# Altium footprint library Led & Displays.PcbLib: 52 footprints (part 4 of 4)
Each footprint in its own frame and in the unit in brackets; x right, y up, seen from the top. Pads: shape width x height; smd on the part's side, far side on the other; paste and mask are expansions set on the pad; w line width, h text height; cw(c..) or ccw(c..) is an arc to the next point about the centre after c.
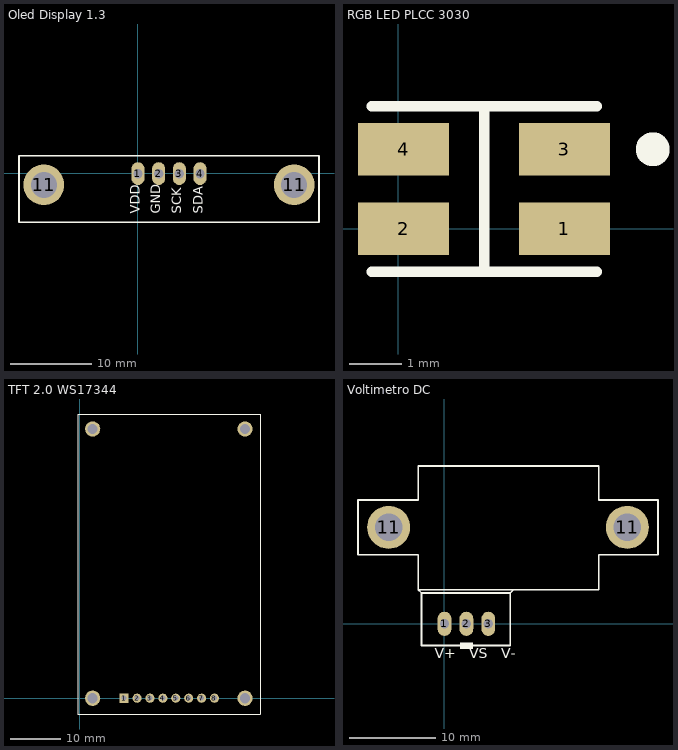
[diagram p3: the footprints below, top view; thin cyan lines are the x and y axes]

## Oled Display 1.3 [mm] "Oled Display I2C 1.3 Inch Module"
pads (6):
  oval 1.6x2.8 hole 1.15: 1(0,-0.015) 2(2.54,-0.015) 3(5.08,-0.015) 4(7.62,-0.015)
  round 5 hole 3.2: 11(-11.557,-1.397) 11(19.177,-1.397)
Top Overlay:
  lines w0.2: -14.605,-5.969 22.225,-5.969 22.225,2.159 21.971,2.159 -14.605,2.159 -14.605,-5.969
  text "VDD" at 0.635,-4.953 h2
  text "GND" at 3.175,-4.953 h2
  text "SCK" at 5.715,-4.953 h2
  text "SDA" at 8.382,-4.953 h2
3D body: height 0.25, standoff 0, extent 4.508,-1.905 4.508,-1.905
3D body "Oled SH1106 1.3.SLDPRT": height 25.6, standoff 13.5, extent -14.19,-32.748 21.81,1.252
3D body "HH4X1.stp": height 8.5, standoff -3.2, extent -1.268,-1.25 9.142,1.25

## RGB LED PLCC 3030 [mm] "LEd RGB Plcc"
pads (4):
  rect 1.75x1 smd: 1(3.195,0) 2(0.107,0) 3(3.195,1.524) 4(0.107,1.524)
Top Overlay:
  circle w0.45: c4.889,1.524 r0.1
  lines w0.2: -0.508,-0.826 3.81,-0.826 ; -0.508,2.349 3.81,2.349 ; 1.651,-0.762 1.651,2.286
3D body "Osram Led PLCC4.step": height 1.95, standoff 0, extent -0.099,-0.638 3.401,2.162

## TFT 2.0 WS17344 [mm] "TFT IPS Display 2.0 Inch Waveshare 17344"
pads (12):
  rect 1.8x1.8 hole 1: 1(8.7,0)
  round 1.8 hole 1: 2(11.239,0) 3(13.779,0) 4(16.319,0) 5(18.86,0) 6(21.399,0) 7(23.939,0) 8(26.479,0)
  round 3 hole 2: ""(2.5,0) ""(2.5,53) ""(32.5,0) ""(32.5,53)
Top Overlay:
  lines w0.2: -0.445,-3.111 -0.445,55.944 35.496,55.944 35.496,-3.111 -0.445,-3.111
3D body: height 9.6, standoff 8, extent 0.064,-2.286 34.734,55.499
3D body: height 8, standoff 0, extent 0.881,51.508 4.119,54.492
3D body: height 8, standoff 0, extent 30.881,51.508 34.119,54.492
3D body: height 8, standoff 0, extent 0.881,-1.492 4.119,1.492
3D body: height 8, standoff 0, extent 30.881,-1.492 34.119,1.492
3D body "HH8X1.stp": height 8.5, standoff -3.2, extent 7.302,-1.25 27.873,1.25

## Voltimetro DC [mm] "Medidor de Voltaje DC 0-30V 2Pin"
pads (5):
  oval 1.6x2.8 hole 1.1: 1(0,-0.015) 2(2.54,-0.015) 3(5.08,-0.015)
  round 5 hole 3.2: 11(-6.477,11.176) 11(21.209,11.176)
Top Overlay:
  rectangle: 1.778,-2.921 3.302,-2.159
  lines w0.2: 8.001,3.937 7.62,3.556 ; -3.048,3.937 -3.048,8.001 -10.033,8.001 -10.033,14.351 -3.048,14.351 -3.048,18.288 17.907,18.288 17.907,14.351 24.765,14.351 24.765,8.001 17.907,8.001 17.907,3.937 -3.048,3.937 ; -3.048,3.937 -2.667,3.556 ; -2.667,3.556 -2.667,-2.54 7.62,-2.54 7.62,3.556 ; -2.667,3.556 7.62,3.556
  text "V+   VS   V-" at -1.143,-4.445 h2
3D body "DC 0-30V Voltmeter Panel Mount.step": height 18.8, standoff 4, extent -8.884,4.049 23.616,18.049
3D body "m3x10.stp": height 10.25, standoff -7.75, extent -9.941,8.176 -3.013,14.176
3D body "m3x10.stp": height 10.25, standoff -7.75, extent 17.745,8.176 24.673,14.176
3D body "JST 3X2.54mm.step": height 7, standoff -3.3, extent -2.507,-2.357 7.493,3.343
3D body: height 0.25, standoff 0, extent 4.508,-1.905 4.508,-1.905